# Altium footprint library HARTING THD.PcbLib: 113 footprints (part 6 of 11)
Each footprint in its own frame and in the unit in brackets; x right, y up, seen from the top. Pads: shape width x height; smd on the part's side, far side on the other; paste and mask are expansions set on the pad; w line width, h text height; cw(c..) or ccw(c..) is an arc to the next point about the centre after c.
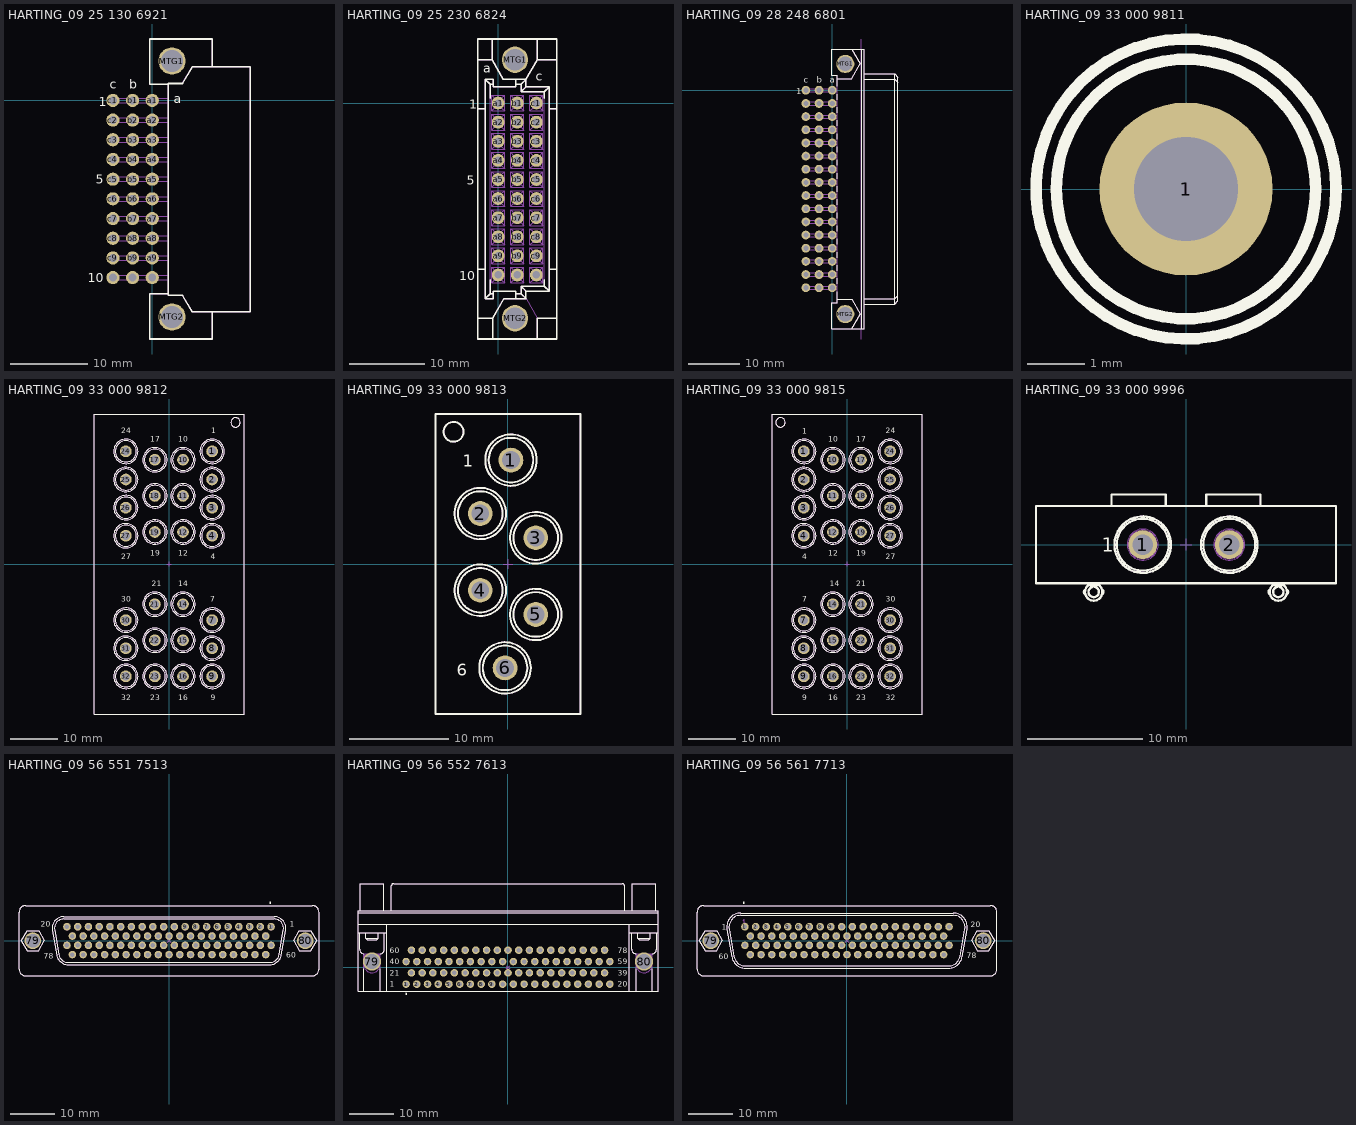
[diagram p5: the footprints below, top view; thin cyan lines are the x and y axes]

## HARTING_09 25 130 6921 [mm] "DIN 41612, Type 3C, Thru-Hole;  Rows a+b+c, 30 Positions, Performance level 2, Lead 3.0mm, Pitch 2.54mm, Right Angle Male Connector"
height 11
pads (32):
  round 1.7 hole 1: a1(0,0) a2(0,-2.54) a3(0,-5.08) a4(0,-7.62) a5(0,-10.16) a6(0,-12.7) a7(0,-15.24) a8(0,-17.78) a9(0,-20.32) a10(0,-22.86) b1(-2.54,0) b2(-2.54,-2.54) b3(-2.54,-5.08) b4(-2.54,-7.62) b5(-2.54,-10.16) b6(-2.54,-12.7) b7(-2.54,-15.24) b8(-2.54,-17.78) b9(-2.54,-20.32) b10(-2.54,-22.86) c1(-5.08,0) c2(-5.08,-2.54) c3(-5.08,-5.08) c4(-5.08,-7.62) c5(-5.08,-10.16) c6(-5.08,-12.7) c7(-5.08,-15.24) c8(-5.08,-17.78) c9(-5.08,-20.32) c10(-5.08,-22.86)
  round 3.5 / inner round 3.5 / far side round 5.1 hole 2.8: MTG1(2.54,5.08) MTG2(2.54,-27.94)
Top Overlay:
  lines w0.2: 2.04,-24.93 -0.31,-24.93 -0.31,-30.78 7.74,-30.78 7.74,-27.28 ; 2.04,2.07 -0.31,2.07 -0.31,7.92 7.74,7.92 7.74,4.32 ; 2.04,-25.14 2.04,2.18 3.897,2.18 5.132,4.32 12.64,4.32 12.64,-27.28 5.132,-27.28 3.897,-25.14 2.04,-25.14
  text "a" at 2.785,-0.395 h1.2
  text "c" at -5.465,1.48 h1.2
  text "b" at -2.94,1.48 h1.2
  text "1" at -6.919,-0.725 h1.2
  text "5" at -7.304,-10.76 h1.2
  text "10" at -8.327,-23.435 h1.2
Mechanical 8:
  lines w0.1: -5.58,-22.86 -5.08,-22.86 ; -5.08,-23.36 -5.08,-22.86 ; -5.08,-22.36 -5.08,-22.86 ; -4.58,-22.86 -5.08,-22.86 ; -3.04,-22.86 -2.54,-22.86 ; -2.54,-23.36 -2.54,-22.86 ; -2.54,-22.36 -2.54,-22.86 ; -2.04,-22.86 -2.54,-22.86 ; -0.5,-22.86 0,-22.86 ; -0.5,0 0,0 ; 0,-23.36 0,-22.86 ; 0,-22.36 0,-22.86 ; 0,-0.5 0,0 ; 0,0.5 0,0 ; 0.5,-22.86 0,-22.86 ; 0.5,0 0,0 ; 2.04,-27.94 2.54,-27.94 ; 2.04,5.08 2.54,5.08 ; 2.54,-28.44 2.54,-27.94 ; 2.54,-27.44 2.54,-27.94 ; 2.54,4.58 2.54,5.08 ; 2.54,5.58 2.54,5.08 ; 3.04,-27.94 2.54,-27.94 ; 3.04,5.08 2.54,5.08 ; -5.08,0 -5.58,0 -5.08,0 ; -5.08,0 -5.08,0.5 -5.08,0 ; -5.08,0 -4.58,0 -5.08,0 ; -5.08,0 -5.08,-0.5 -5.08,0 ; -2.54,0 -3.04,0 -2.54,0 ; -2.54,0 -2.54,0.5 -2.54,0 ; -2.54,0 -2.04,0 -2.54,0 ; -2.54,0 -2.54,-0.5 -2.54,0
Mechanical 14:
  lines w0.1: 2.04,-24.93 -0.31,-24.93 -0.31,-30.78 7.74,-30.78 7.74,-27.28 ; 2.04,-23.16 -5.08,-23.16 cw(c-5.08,-22.86) -5.08,-22.56 2.04,-22.562 ; 2.04,-20.62 -5.08,-20.62 cw(c-5.08,-20.32) -5.08,-20.02 2.04,-20.022 ; 2.04,-18.08 -5.08,-18.08 cw(c-5.08,-17.78) -5.08,-17.48 2.04,-17.482 ; 2.04,-15.54 -5.08,-15.54 cw(c-5.08,-15.24) -5.08,-14.94 2.04,-14.942 ; 2.04,-13 -5.08,-13 cw(c-5.08,-12.7) -5.08,-12.4 2.04,-12.402 ; 2.04,-10.46 -5.08,-10.46 cw(c-5.08,-10.16) -5.08,-9.86 2.04,-9.862 ; 2.04,-7.92 -5.08,-7.92 cw(c-5.08,-7.62) -5.08,-7.32 2.04,-7.322 ; 2.04,-5.38 -5.08,-5.38 cw(c-5.08,-5.08) -5.08,-4.78 2.04,-4.782 ; 2.04,-2.84 -5.08,-2.84 cw(c-5.08,-2.54) -5.08,-2.24 2.04,-2.242 ; 2.04,-0.3 -5.08,-0.3 cw(c-5.08,0) -5.08,0.3 2.04,0.298 ; 2.04,2.07 -0.31,2.07 -0.31,7.92 7.74,7.92 7.74,4.32 ; 2.04,-25.14 2.04,2.18 3.897,2.18 5.132,4.32 12.64,4.32 12.64,-27.28 5.132,-27.28 3.897,-25.14 2.04,-25.14
  text "c" at -5.465,1.48 h1.2
  text "b" at -2.94,1.48 h1.2
  text "5" at -7.304,-10.76 h1.2
  text "1" at -6.919,-0.725 h1.2
  text "10" at -8.327,-23.435 h1.2
3D body "HARTING_09 25 130 6921.stp": height 9.35, standoff -3, extent -5.38,-30.78 12.64,7.92

## HARTING_09 25 230 6824 [mm] "DIN 41612, Type 3C, Thru-Hole;  Rows a+b+c, 30 Positions, Performance level 2, Lead 2.9 mm, Pitch 2.54mm, Vertical Female Connector"
height 11.6
pads (32):
  round 1.7 hole 1: a1(0,0) a2(0,-2.54) a3(0,-5.08) a4(0,-7.62) a5(0,-10.16) a6(0,-12.7) a7(0,-15.24) a8(0,-17.78) a9(0,-20.32) a10(0,-22.86) b1(2.54,0) b2(2.54,-2.54) b3(2.54,-5.08) b4(2.54,-7.62) b5(2.54,-10.16) b6(2.54,-12.7) b7(2.54,-15.24) b8(2.54,-17.78) b9(2.54,-20.32) b10(2.54,-22.86) c1(5.08,0) c2(5.08,-2.54) c3(5.08,-5.08) c4(5.08,-7.62) c5(5.08,-10.16) c6(5.08,-12.7) c7(5.08,-15.24) c8(5.08,-17.78) c9(5.08,-20.32) c10(5.08,-22.86)
  round 3.5 / inner round 3.5 / far side round 5.1 hole 2.8: MTG1(2.24,5.76) MTG2(2.24,-28.62)
Top Overlay:
  lines w0.2: -2.71,-28.62 -0.735,-28.62 ; -2.71,-22.12 -1.71,-22.12 ; -2.71,-0.74 -1.71,-0.74 ; -2.71,5.76 -0.81,5.76 ; -1.06,-23.523 -1.06,-25.355 ; -1.06,0.662 -1.06,2.495 ; -0.81,8.52 -0.81,5.76 ; -0.735,-31.38 -0.735,-28.62 ; -0.66,-25.355 -1.06,-25.355 ; -0.66,2.495 -1.06,2.495 ; 2.34,-26.005 2.34,-25.005 -0.66,-25.005 -0.66,-26.005 -1.71,-26.005 ; 2.34,-25.355 3.04,-25.355 ; 2.34,2.495 3.04,2.495 ; 2.34,3.145 2.34,2.145 -0.66,2.145 -0.66,3.145 -1.71,3.145 ; 3.705,-26.005 0.775,-26.005 -0.735,-28.62 ; 5.19,8.52 5.19,5.76 ; 5.215,-31.38 5.215,-28.62 7.79,-28.62 ; 6.14,-23.523 6.14,-24.355 ; 6.14,0.662 6.14,1.495 ; 6.79,-22.12 7.79,-22.12 ; 6.79,-0.74 7.79,-0.74 ; 7.79,5.76 5.19,5.76 ; -1.71,-26.005 -1.06,-25.355 ; -1.71,-26.005 -1.71,3.145 ; -1.71,3.145 -1.06,2.495 ; -0.81,5.76 0.7,3.145 3.69,3.145 ; 3.04,-25.355 3.69,-26.005 3.69,-25.005 ; 3.04,-25.355 3.04,-24.355 ; 3.04,-24.355 3.69,-25.005 ; 3.04,-24.355 6.14,-24.355 ; 3.04,1.495 3.69,2.145 ; 3.04,1.495 6.14,1.495 ; 3.04,1.495 3.04,2.495 ; 3.04,2.495 3.69,3.145 ; 3.69,-25.005 6.79,-25.005 ; 3.69,2.145 3.69,3.145 ; 3.69,2.145 6.79,2.145 ; 3.69,3.145 5.19,5.76 ; 6.14,-24.355 6.79,-25.005 ; 6.14,1.495 6.79,2.145 ; 6.79,-25.005 6.79,2.145 ; -2.71,-31.38 -2.71,8.52 7.79,8.52 7.79,-31.38 -2.71,-31.38
  text "a" at -2,4 h1.2
  text "1" at -3.839,-0.725 h1.2
  text "5" at -4.174,-10.885 h1.2
  text "10" at -5.172,-23.535 h1.2
  text "c" at 4.975,2.95 h1.2
Mechanical 8:
  lines w0.1: -0.5,-22.86 0,-22.86 ; -0.5,0 0,0 ; 0,-23.36 0,-22.86 ; 0,-22.36 0,-22.86 ; 0,-0.5 0,0 ; 0,0.5 0,0 ; 0.5,-22.86 0,-22.86 ; 0.5,0 0,0 ; 1.74,-28.62 2.24,-28.62 ; 1.74,5.76 2.24,5.76 ; 2.04,-22.86 2.54,-22.86 ; 2.04,0 2.54,0 ; 2.24,-29.12 2.24,-28.62 ; 2.24,-28.12 2.24,-28.62 ; 2.24,5.26 2.24,5.76 ; 2.24,6.26 2.24,5.76 ; 2.54,-23.36 2.54,-22.86 ; 2.54,-22.36 2.54,-22.86 ; 2.54,-0.5 2.54,0 ; 2.54,0.5 2.54,0 ; 2.74,-28.62 2.24,-28.62 ; 2.74,5.76 2.24,5.76 ; 3.04,-22.86 2.54,-22.86 ; 3.04,0 2.54,0 ; 4.58,-22.86 5.08,-22.86 ; 4.58,0 5.08,0 ; 5.08,-23.36 5.08,-22.86 ; 5.08,-22.36 5.08,-22.86 ; 5.08,-0.5 5.08,0 ; 5.08,0.5 5.08,0 ; 5.58,-22.86 5.08,-22.86 ; 5.58,0 5.08,0
Mechanical 14:
  drawing of 422 lines, arcs and shapes, not listed
  text "5" at -4.174,-10.885 h1.2
  text "1" at -3.839,-0.725 h1.2
  text "10" at -5.172,-23.535 h1.2
  text "a" at -2,4 h1.2
  text "c" at 4.975,2.95 h1.2
3D body "HARTING_09 25 230 6824.stp": height 11.6, standoff -2.9, extent -2.71,-31.38 7.79,8.52

## HARTING_09 28 248 6801 [mm] "DIN 41612, Type 2R, Thru-Hole;  Rows a+b+c, 48 Position, Performance level 2, Lead 3mm, Pitch 2.54mm, Right Angle Female Connector"
height 11.6
pads (50):
  round 1.7 hole 1: a1(0,0) a2(0,-2.54) a3(0,-5.08) a4(0,-7.62) a5(0,-10.16) a6(0,-12.7) a7(0,-15.24) a8(0,-17.78) a9(0,-20.32) a10(0,-22.86) a11(0,-25.4) a12(0,-27.94) a13(0,-30.48) a14(0,-33.02) a15(0,-35.56) a16(0,-38.1) b1(-2.54,0) b2(-2.54,-2.54) b3(-2.54,-5.08) b4(-2.54,-7.62) b5(-2.54,-10.16) b6(-2.54,-12.7) b7(-2.54,-15.24) b8(-2.54,-17.78) b9(-2.54,-20.32) b10(-2.54,-22.86) b11(-2.54,-25.4) b12(-2.54,-27.94) b13(-2.54,-30.48) b14(-2.54,-33.02) b15(-2.54,-35.56) b16(-2.54,-38.1) c1(-5.08,0) c2(-5.08,-2.54) c3(-5.08,-5.08) c4(-5.08,-7.62) c5(-5.08,-10.16) c6(-5.08,-12.7) c7(-5.08,-15.24) c8(-5.08,-17.78) c9(-5.08,-20.32) c10(-5.08,-22.86) c11(-5.08,-25.4) c12(-5.08,-27.94) c13(-5.08,-30.48) c14(-5.08,-33.02) c15(-5.08,-35.56) c16(-5.08,-38.1)
  round 3.5 / inner round 3.5 / far side round 5.1 hole 2.8: MTG1(2.54,5.08) MTG2(2.54,-43.18)
Top Overlay:
  lines w0.2: 0.94,-40.36 3.798,-40.36 5.427,-43.18 3.798,-46 ; 0.94,-38.846 0.94,-41 -0.06,-41 -0.06,-46 6.19,-46 6.19,7.9 -0.06,7.9 -0.06,2.9 0.94,2.9 0.94,0.746 ; 0.94,-37.354 0.94,-36.306 ; 0.94,-34.814 0.94,-33.766 ; 0.94,-32.274 0.94,-31.226 ; 0.94,-29.734 0.94,-28.686 ; 0.94,-27.194 0.94,-26.146 ; 0.94,-24.654 0.94,-23.606 ; 0.94,-22.114 0.94,-21.066 ; 0.94,-19.574 0.94,-18.526 ; 0.94,-17.034 0.94,-15.986 ; 0.94,-14.494 0.94,-13.446 ; 0.94,-11.954 0.94,-10.906 ; 0.94,-9.414 0.94,-8.366 ; 0.94,-6.874 0.94,-5.826 ; 0.94,-4.334 0.94,-3.286 ; 0.94,-1.794 0.94,-0.746 ; 0.94,2.26 3.798,2.26 5.427,5.08 3.798,7.9 ; 5.59,-46 5.59,7.9 ; 6.19,-41.25 12.04,-41.25 ; 6.19,-40.25 12.04,-40.25 12.64,-39.65 ; 6.19,2.15 12.04,2.15 12.64,1.55 ; 6.19,3.15 12.04,3.15 ; 12.04,-41.25 12.04,3.15 ; 12.04,-41.25 12.64,-40.65 12.64,2.55 12.04,3.15
  text "1" at -6.919,-0.725 h1.2
  text "b" at -2.94,1.48 h1.2
  text "c" at -5.465,1.48 h1.2
  text "a" at -0.5,1.5 h1.2
Mechanical 8:
  lines w0.05: -5.58,-38.1 -5.08,-38.1 ; -5.58,0 -5.08,0 ; -5.08,-38.6 -5.08,-38.1 ; -5.08,-37.6 -5.08,-38.1 ; -5.08,-0.5 -5.08,0 ; -5.08,0.5 -5.08,0 ; -4.58,-38.1 -5.08,-38.1 ; -4.58,0 -5.08,0 ; -3.04,-38.1 -2.54,-38.1 ; -3.04,0 -2.54,0 ; -2.54,-38.6 -2.54,-38.1 ; -2.54,-37.6 -2.54,-38.1 ; -2.54,-0.5 -2.54,0 ; -2.54,0.5 -2.54,0 ; -2.04,-38.1 -2.54,-38.1 ; -2.04,0 -2.54,0 ; -0.5,-38.1 0,-38.1 ; -0.5,0 0,0 ; 0,-38.6 0,-38.1 ; 0,-37.6 0,-38.1 ; 0,-0.5 0,0 ; 0,0.5 0,0 ; 0.5,-38.1 0,-38.1 ; 0.5,0 0,0 ; 2.04,-43.18 2.54,-43.18 ; 2.04,5.08 2.54,5.08 ; 2.54,-43.68 2.54,-43.18 ; 2.54,-42.68 2.54,-43.18 ; 2.54,4.58 2.54,5.08 ; 2.54,5.58 2.54,5.08 ; 3.04,-43.18 2.54,-43.18 ; 3.04,5.08 2.54,5.08 ; 5.59,-48 5.59,9.9
Mechanical 14:
  circle w0.1: c2.54,5.08 r1.25
  circle w0.1: c2.54,-43.18 r1.25
  lines w0.1: 0.94,-40.36 3.798,-40.36 5.427,-43.18 3.798,-46 ; 0.94,-38.4 -5.08,-38.4 cw(c-5.08,-38.1) -5.08,-37.8 0.94,-37.8 ; 0.94,-35.86 -5.08,-35.86 cw(c-5.08,-35.56) -5.08,-35.26 0.94,-35.26 ; 0.94,-33.32 -5.08,-33.32 cw(c-5.08,-33.02) -5.08,-32.72 0.94,-32.72 ; 0.94,-30.78 -5.08,-30.78 cw(c-5.08,-30.48) -5.08,-30.18 0.94,-30.18 ; 0.94,-28.24 -5.08,-28.24 cw(c-5.08,-27.94) -5.08,-27.64 0.94,-27.64 ; 0.94,-25.7 -5.08,-25.7 cw(c-5.08,-25.4) -5.08,-25.1 0.94,-25.1 ; 0.94,-23.16 -5.08,-23.16 cw(c-5.08,-22.86) -5.08,-22.56 0.94,-22.56 ; 0.94,-20.62 -5.08,-20.62 cw(c-5.08,-20.32) -5.08,-20.02 0.94,-20.02 ; 0.94,-18.08 -5.08,-18.08 cw(c-5.08,-17.78) -5.08,-17.48 0.94,-17.48 ; 0.94,-15.54 -5.08,-15.54 cw(c-5.08,-15.24) -5.08,-14.94 0.94,-14.94 ; 0.94,-13 -5.08,-13 cw(c-5.08,-12.7) -5.08,-12.4 0.94,-12.4 ; 0.94,-10.46 -5.08,-10.46 cw(c-5.08,-10.16) -5.08,-9.86 0.94,-9.86 ; 0.94,-7.92 -5.08,-7.92 cw(c-5.08,-7.62) -5.08,-7.32 0.94,-7.32 ; 0.94,-5.38 -5.08,-5.38 cw(c-5.08,-5.08) -5.08,-4.78 0.94,-4.78 ; 0.94,-2.84 -5.08,-2.84 cw(c-5.08,-2.54) -5.08,-2.24 0.94,-2.24 ; 0.94,-0.3 -5.08,-0.3 cw(c-5.08,0) -5.08,0.3 0.94,0.3 ; 0.94,2.26 3.798,2.26 5.427,5.08 3.798,7.9 ; 5.59,-46 5.59,7.9 ; 6.19,-41.25 12.04,-41.25 ; 6.19,-40.25 12.04,-40.25 12.64,-39.65 ; 6.19,2.15 12.04,2.15 12.64,1.55 ; 6.19,3.15 12.04,3.15 ; 12.04,-41.25 12.04,3.15 ; 12.04,-41.25 12.64,-40.65 12.64,2.55 12.04,3.15 ; -0.06,-46 -0.06,-41 0.94,-41 0.94,2.9 -0.06,2.9 -0.06,7.9 6.19,7.9 6.19,-46 -0.06,-46
  text "1" at -6.919,-0.725 h1.2
  text "b" at -2.94,1.48 h1.2
  text "c" at -5.465,1.48 h1.2
3D body "HARTING_09 28 248 6801.stp": height 9.15, standoff -3, extent -5.38,-46 12.64,7.9

## HARTING_09 33 000 9811 [mm] "Single PC Board Adaptor for Han E Module"
height 23
pads (1):
  round 3 hole 1.8: 1(0,0)
Top Overlay:
  circle w0.2: c0,0 r2.6
  circle w0.2: c0,0 r2.25
Mechanical 8:
  lines w0.05: -0.5,0 0,0 ; 0,-0.5 0,0 ; 0,0.5 0,0 ; 0.5,0 0,0
Mechanical 14:
  circle w0.1: c0,0 r2.6
  circle w0.1: c0,0 r1.25
  circle w0.1: c0,0 r2.25
3D body "HARTING_09 33 000 9811.stp": height 23, standoff -4.6, extent -2.6,-2.6 2.6,2.6

## HARTING_09 33 000 9812 [mm] "Han 32EE-f PCB Matrix With Contacts"
height 26
pads (26):
  round 2.5 hole 1.8: 1(9.193,24.026) 2(9.193,18.026) 3(9.193,12.026) 4(9.193,6.026) 7(9.193,-11.974) 8(9.193,-17.974) 9(9.193,-23.974) 10(2.993,22.226) 11(2.993,14.526) 12(2.993,6.826) 14(2.993,-8.574) 15(2.993,-16.274) 16(2.993,-23.974) 17(-3.007,22.226) 18(-3.007,14.526) 19(-3.007,6.826) 21(-3.007,-8.574) 22(-3.007,-16.274) 23(-3.007,-23.974) 24(-9.207,24.026) 25(-9.207,18.026) 26(-9.207,12.026) 27(-9.207,6.026) 30(-9.207,-11.974) 31(-9.207,-17.974) 32(-9.207,-23.974)
Top Overlay:
  circle w0.2: c9.193,-23.974 r2.25
  circle w0.2: c2.993,-23.974 r2.25
  circle w0.2: c-3.007,-23.974 r2.25
  circle w0.2: c-9.207,-23.974 r2.25
  circle w0.2: c-9.207,-17.974 r2.25
  circle w0.2: c-3.007,-16.274 r2.25
  circle w0.2: c2.993,-16.274 r2.25
  circle w0.2: c9.193,-17.974 r2.25
  circle w0.2: c9.193,-11.974 r2.25
  circle w0.2: c-9.207,-11.974 r2.25
  circle w0.2: c-3.007,-8.574 r2.25
  circle w0.2: c2.993,-8.574 r2.25
  circle w0.2: c9.193,6.026 r2.25
  circle w0.2: c2.993,6.826 r2.25
  circle w0.2: c-3.007,6.826 r2.25
  circle w0.2: c-9.207,6.026 r2.25
  circle w0.2: c-9.207,12.026 r2.25
  circle w0.2: c-3.007,14.526 r2.25
  circle w0.2: c9.193,12.026 r2.25
  circle w0.2: c2.993,14.526 r2.25
  circle w0.2: c9.193,18.026 r2.25
  circle w0.2: c9.193,24.026 r2.25
  circle w0.2: c2.993,22.226 r2.25
  circle w0.2: c-3.007,22.226 r2.25
  circle w0.2: c-9.207,24.026 r2.25
  circle w0.2: c-9.207,24.026 r2.6
  circle w0.2: c-3.007,22.226 r2.6
  circle w0.2: c2.993,22.226 r2.6
  circle w0.2: c9.193,24.026 r2.6
  circle w0.2: c9.193,18.026 r2.6
  circle w0.2: c9.193,12.026 r2.6
  circle w0.2: c9.193,6.026 r2.6
  circle w0.2: c2.993,6.826 r2.6
  circle w0.2: c2.993,14.526 r2.6
  circle w0.2: c-3.007,14.526 r2.6
  circle w0.2: c-9.207,12.026 r2.6
  circle w0.2: c-3.007,6.826 r2.6
  circle w0.2: c-9.207,6.026 r2.6
  circle w0.2: c2.993,-8.574 r2.6
  circle w0.2: c9.193,-11.974 r2.6
  circle w0.2: c9.193,-17.974 r2.6
  circle w0.2: c9.193,-23.974 r2.6
  circle w0.2: c2.993,-16.274 r2.6
  circle w0.2: c2.993,-23.974 r2.6
  circle w0.2: c-3.007,-23.974 r2.6
  circle w0.2: c-3.007,-16.274 r2.6
  circle w0.2: c-3.007,-8.574 r2.6
  circle w0.2: c-9.207,-11.974 r2.6
  circle w0.2: c-9.207,-17.974 r2.6
  circle w0.2: c-9.207,-23.974 r2.6
  circle w0.2: c-9.207,18.026 r2.25
  circle w0.2: c-9.207,18.026 r2.6
  circle w0.2: c14.2,30.2 r1
  lines w0.2: -16,-32 16,-32 16,32 -16,32 -16,-32
  text "32" at -10.175,-29.026 h1.2
  text "30" at -10.175,-8.101 h1.2
  text "27" at -10.175,0.974 h1.2
  text "24" at -10.175,27.899 h1.2
  text "1" at 9.05,27.899 h1.2
  text "14" at 2.025,-4.701 h1.2
  text "21" at -3.725,-4.701 h1.2
  text "19" at -3.975,1.774 h1.2
  text "12" at 2.025,1.774 h1.2
  text "17" at -3.975,26.099 h1.2
  text "10" at 2.025,26.099 h1.2
  text "16" at 2.025,-29.026 h1.2
  text "23" at -3.975,-29.026 h1.2
  text "4" at 8.875,0.974 h1.2
  text "7" at 8.825,-8.101 h1.2
  text "9" at 8.875,-29.026 h1.2
Bottom Overlay:
  text "32" at -8.3,-29.026 h1.2
  text "30" at -8.45,-8.125 h1.2
  text "27" at -8.55,0.974 h1.2
  text "24" at -8.225,27.899 h1.2
  text "1" at 9.35,27.899 h1.2
  text "23" at -2.075,-29.026 h1.2
  text "16" at 3.65,-29.026 h1.2
  text "10" at 3.975,26.099 h1.2
  text "17" at -2.025,26.099 h1.2
  text "12" at 3.675,1.774 h1.2
  text "19" at -2.35,1.774 h1.2
  text "21" at -2.25,-4.675 h1.2
  text "14" at 3.75,-4.725 h1.2
  text "4" at 9.75,0.949 h1.2
  text "7" at 9.6,-8.125 h1.2
  text "9" at 9.625,-29.026 h1.2
Mechanical 8:
  lines w0.1: -9.707,-23.974 -9.207,-23.974 ; -9.707,-17.974 -9.207,-17.974 ; -9.707,-11.974 -9.207,-11.974 ; -9.707,6.026 -9.207,6.026 ; -9.707,12.026 -9.207,12.026 ; -9.707,18.026 -9.207,18.026 ; -9.707,24.026 -9.207,24.026 ; -9.207,-24.474 -9.207,-23.974 ; -9.207,-23.474 -9.207,-23.974 ; -9.207,-18.474 -9.207,-17.974 ; -9.207,-17.474 -9.207,-17.974 ; -9.207,-12.474 -9.207,-11.974 ; -9.207,-11.474 -9.207,-11.974 ; -9.207,5.526 -9.207,6.026 ; -9.207,6.526 -9.207,6.026 ; -9.207,11.526 -9.207,12.026 ; -9.207,12.526 -9.207,12.026 ; -9.207,17.526 -9.207,18.026 ; -9.207,18.526 -9.207,18.026 ; -9.207,23.526 -9.207,24.026 ; -9.207,24.526 -9.207,24.026 ; -8.707,-23.974 -9.207,-23.974 ; -8.707,-17.974 -9.207,-17.974 ; -8.707,-11.974 -9.207,-11.974 ; -8.707,6.026 -9.207,6.026 ; -8.707,12.026 -9.207,12.026 ; -8.707,18.026 -9.207,18.026 ; -8.707,24.026 -9.207,24.026 ; -3.507,-23.974 -3.007,-23.974 ; -3.507,-16.274 -3.007,-16.274 ; -3.507,-8.574 -3.007,-8.574 ; -3.507,6.826 -3.007,6.826 ; -3.507,14.526 -3.007,14.526 ; -3.507,22.226 -3.007,22.226 ; -3.007,-24.474 -3.007,-23.974 ; -3.007,-23.474 -3.007,-23.974 ; -3.007,-16.774 -3.007,-16.274 ; -3.007,-15.774 -3.007,-16.274 ; -3.007,-9.074 -3.007,-8.574 ; -3.007,-8.074 -3.007,-8.574 ; -3.007,6.326 -3.007,6.826 ; -3.007,7.326 -3.007,6.826 ; -3.007,14.026 -3.007,14.526 ; -3.007,15.026 -3.007,14.526 ; -3.007,21.726 -3.007,22.226 ; -3.007,22.726 -3.007,22.226 ; -2.507,-23.974 -3.007,-23.974 ; -2.507,-16.274 -3.007,-16.274 ; -2.507,-8.574 -3.007,-8.574 ; -2.507,6.826 -3.007,6.826 ; -2.507,14.526 -3.007,14.526 ; -2.507,22.226 -3.007,22.226 ; -0.5,0 0,0 ; 0,-0.5 0,0 ; 0,0.5 0,0 ; 0.5,0 0,0 ; 2.493,-23.974 2.993,-23.974 ; 2.493,-16.274 2.993,-16.274 ; 2.493,-8.574 2.993,-8.574 ; 2.493,6.826 2.993,6.826 ; 2.493,14.526 2.993,14.526 ; 2.493,22.226 2.993,22.226 ; 2.993,-24.474 2.993,-23.974 ; 2.993,-23.474 2.993,-23.974 ; 2.993,-16.774 2.993,-16.274 ; 2.993,-15.774 2.993,-16.274 ; 2.993,-9.074 2.993,-8.574 ; 2.993,-8.074 2.993,-8.574 ; 2.993,6.326 2.993,6.826 ; 2.993,7.326 2.993,6.826 ; 2.993,14.026 2.993,14.526 ; 2.993,15.026 2.993,14.526 ; 2.993,21.726 2.993,22.226 ; 2.993,22.726 2.993,22.226 ; 3.493,-23.974 2.993,-23.974 ; 3.493,-16.274 2.993,-16.274 ; 3.493,-8.574 2.993,-8.574 ; 3.493,6.826 2.993,6.826 ; 3.493,14.526 2.993,14.526 ; 3.493,22.226 2.993,22.226 ; 8.693,-23.974 9.193,-23.974 ; 8.693,-17.974 9.193,-17.974 ; 8.693,-11.974 9.193,-11.974 ; 8.693,6.026 9.193,6.026 ; 8.693,12.026 9.193,12.026 ; 8.693,18.026 9.193,18.026 ; 8.693,24.026 9.193,24.026 ; 9.193,-24.474 9.193,-23.974 ; 9.193,-23.474 9.193,-23.974 ; 9.193,-18.474 9.193,-17.974 ; 9.193,-17.474 9.193,-17.974 ; 9.193,-12.474 9.193,-11.974 ; 9.193,-11.474 9.193,-11.974 ; 9.193,5.526 9.193,6.026 ; 9.193,6.526 9.193,6.026 ; 9.193,11.526 9.193,12.026 ; 9.193,12.526 9.193,12.026 ; 9.193,17.526 9.193,18.026 ; 9.193,18.526 9.193,18.026 ; 9.193,23.526 9.193,24.026 ; 9.193,24.526 9.193,24.026 ; 9.693,-23.974 9.193,-23.974 ; 9.693,-17.974 9.193,-17.974 ; 9.693,-11.974 9.193,-11.974 ; 9.693,6.026 9.193,6.026 ; 9.693,12.026 9.193,12.026 ; 9.693,18.026 9.193,18.026 ; 9.693,24.026 9.193,24.026
Mechanical 14:
  circle w0.1: c-9.207,12.026 r2.25
  circle w0.1: c-9.207,24.026 r2.25
  circle w0.1: c-9.207,24.026 r2.6
  circle w0.1: c-3.007,22.226 r2.25
  circle w0.1: c2.993,22.226 r2.25
  circle w0.1: c9.193,24.026 r2.25
  circle w0.1: c9.193,18.026 r2.25
  circle w0.1: c9.193,12.026 r2.25
  circle w0.1: c9.193,6.026 r2.25
  circle w0.1: c2.993,6.826 r2.25
  circle w0.1: c2.993,14.526 r2.25
  circle w0.1: c-3.007,14.526 r2.25
  circle w0.1: c-3.007,6.826 r2.25
  circle w0.1: c-9.207,6.026 r2.25
  circle w0.1: c2.993,-8.574 r2.25
  circle w0.1: c9.193,-11.974 r2.25
  circle w0.1: c9.193,-17.974 r2.25
  circle w0.1: c9.193,-23.974 r2.25
  circle w0.1: c2.993,-16.274 r2.25
  circle w0.1: c2.993,-23.974 r2.25
  circle w0.1: c-3.007,-23.974 r2.25
  circle w0.1: c-3.007,-16.274 r2.25
  circle w0.1: c-3.007,-8.574 r2.25
  circle w0.1: c-9.207,-11.974 r2.25
  circle w0.1: c-9.207,-17.974 r2.25
  circle w0.1: c-9.207,-23.974 r2.25
  circle w0.1: c-9.207,18.026 r2.25
  circle w0.1: c-9.207,18.026 r2.6
  circle w0.1: c14.2,30.2 r1
  circle w0.1: c-3.007,22.226 r2.6
  circle w0.1: c2.993,22.226 r2.6
  circle w0.1: c-3.007,14.526 r2.6
  circle w0.1: c2.993,14.526 r2.6
  circle w0.1: c-9.207,12.026 r2.6
  circle w0.1: c9.193,18.026 r2.6
  circle w0.1: c9.193,24.026 r2.6
  circle w0.1: c9.193,12.026 r2.6
  circle w0.1: c9.193,6.026 r2.6
  circle w0.1: c2.993,6.826 r2.6
  circle w0.1: c-3.007,6.826 r2.6
  circle w0.1: c-9.207,6.026 r2.6
  circle w0.1: c-3.007,-8.574 r2.6
  circle w0.1: c2.993,-8.574 r2.6
  circle w0.1: c-9.207,-11.974 r2.6
  circle w0.1: c-9.207,-17.974 r2.6
  circle w0.1: c-9.207,-23.974 r2.6
  circle w0.1: c-3.007,-23.974 r2.6
  circle w0.1: c-3.007,-16.274 r2.6
  circle w0.1: c2.993,-16.274 r2.6
  circle w0.1: c2.993,-23.974 r2.6
  circle w0.1: c9.193,-23.974 r2.6
  circle w0.1: c9.193,-17.974 r2.6
  circle w0.1: c9.193,-11.974 r2.6
  lines w0.1: -16,-32 16,-32 16,32 -16,32 -16,-32
  text "32" at -10.175,-29.026 h1.2
  text "30" at -10.175,-8.101 h1.2
  text "27" at -10.175,0.974 h1.2
  text "24" at -10.175,27.899 h1.2
  text "1" at 9.05,27.899 h1.2
  text "14" at 2.025,-4.701 h1.2
  text "21" at -3.725,-4.701 h1.2
  text "19" at -3.975,1.774 h1.2
  text "12" at 2.025,1.774 h1.2
  text "17" at -3.975,26.099 h1.2
  text "10" at 2.025,26.099 h1.2
  text "16" at 2.025,-29.026 h1.2
  text "23" at -3.975,-29.026 h1.2
  text "4" at 8.875,0.974 h1.2
  text "7" at 8.825,-8.101 h1.2
  text "9" at 8.875,-29.026 h1.2
3D body "HARTING_09 33 000 9812.stp": height 26, standoff -4.6, extent -16,-32 16,32
